# Altium footprint library 14-Inductors.PcbLib: 164 footprints (part 8 of 11)
Each footprint in its own frame and in the unit in brackets; x right, y up, seen from the top. Pads: shape width x height; smd on the part's side, far side on the other; paste and mask are expansions set on the pad; w line width, h text height; cw(c..) or ccw(c..) is an arc to the next point about the centre after c.
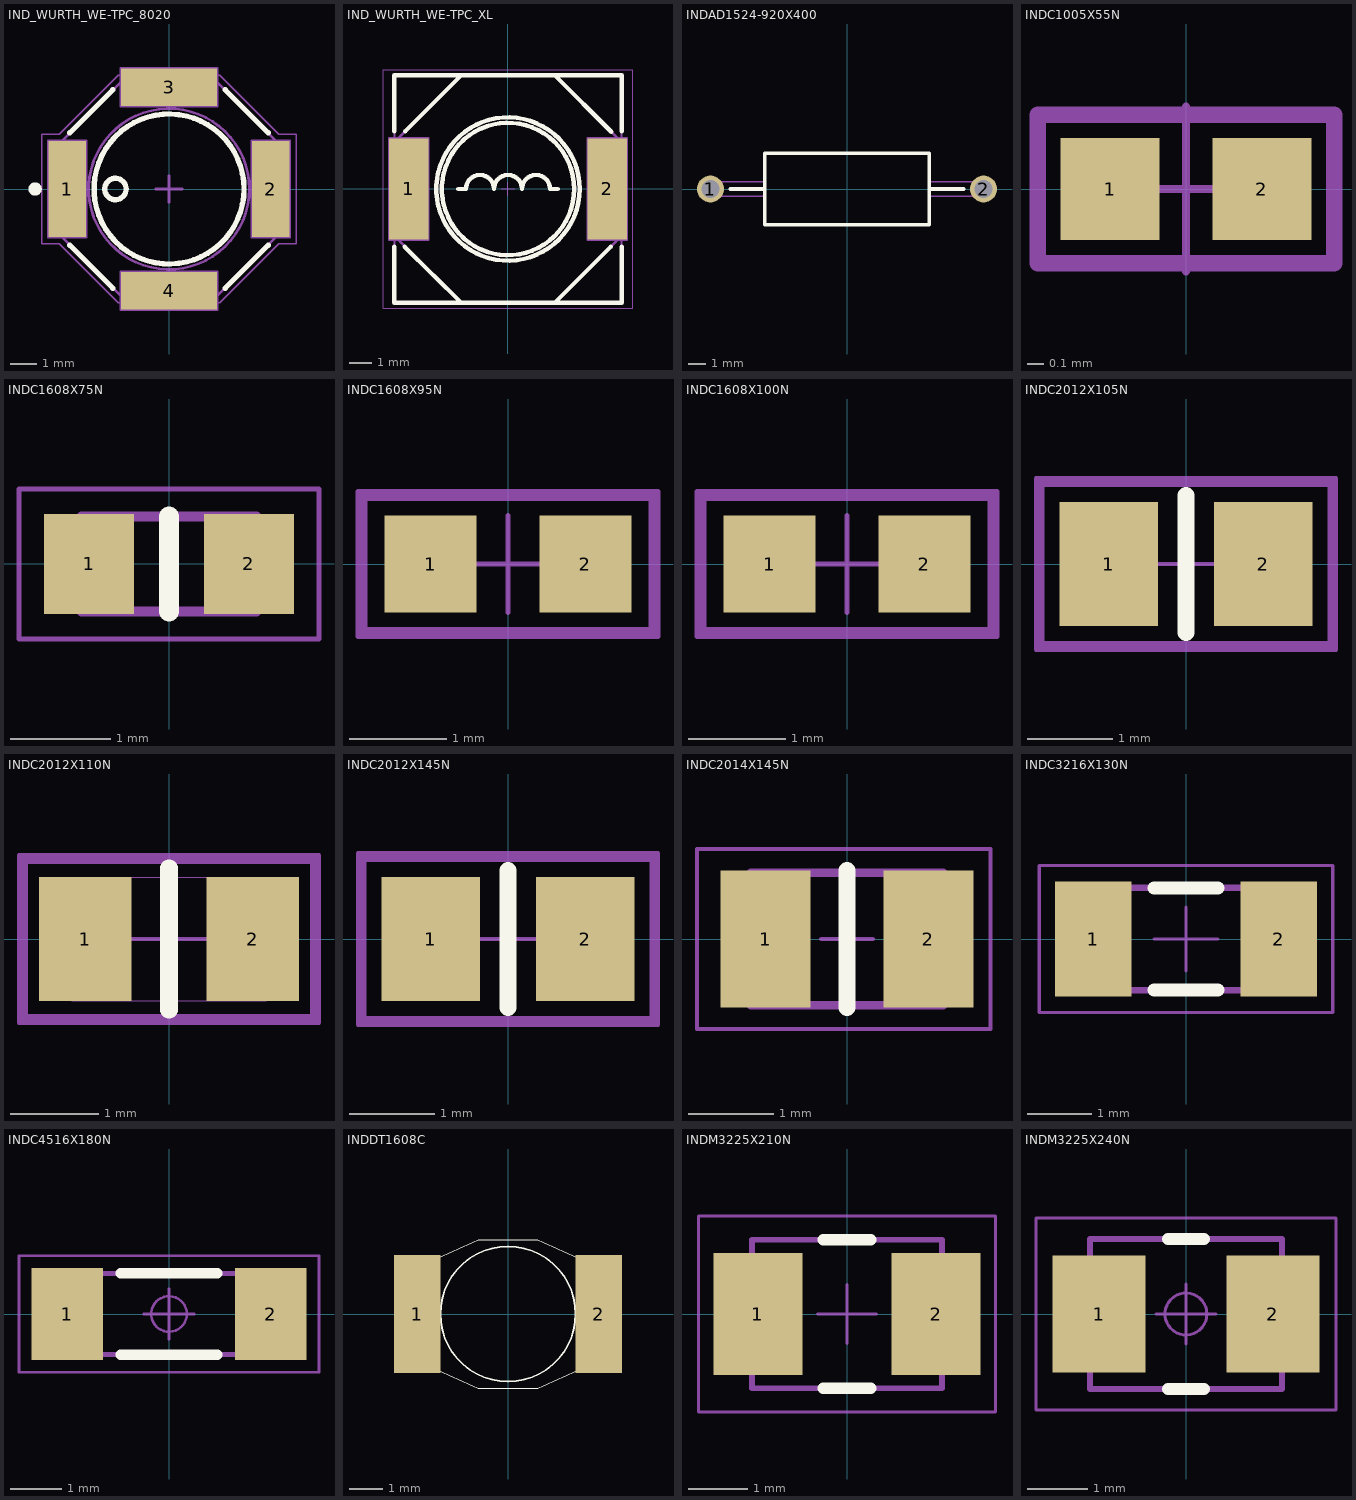
[diagram p7: the footprints below, top view; thin cyan lines are the x and y axes]

## IND_WURTH_WE-TPC_8020 [mm] "Power Choke Inductor, Body 8x8mm"
height 2
pads (4):
  rect 1.4x3.6 smd: 1(-3.8,0) 2(3.8,0)
  rect 3.6x1.4 smd: 3(0,3.8) 4(0,-3.8)
Top Overlay:
  circle w0.2: c-2,0 r0.4
  circle w0.25: c-5,0 r0.125
  circle w0.2: c0,0 r2.8
  lines w0.2: -3.7,-2.1 -2.1,-3.7 ; -3.7,2.1 -2.1,3.7 ; 2.1,-3.7 3.7,-2.1 ; 2.1,3.7 3.7,2.1
Mechanical 8:
  lines w0.1: -4.3,0 -3.8,0 ; -3.8,-0.5 -3.8,0 ; -3.8,0.5 -3.8,0 ; -3.3,0 -3.8,0 ; -0.5,-3.8 0,-3.8 ; -0.5,0 0,0 ; -0.5,3.8 0,3.8 ; 0,-4.3 0,-3.8 ; 0,-3.3 0,-3.8 ; 0,-0.5 0,0 ; 0,0.5 0,0 ; 0,3.3 0,3.8 ; 0,4.3 0,3.8 ; 0.5,-3.8 0,-3.8 ; 0.5,0 0,0 ; 0.5,3.8 0,3.8 ; 3.3,0 3.8,0 ; 3.8,-0.5 3.8,0 ; 3.8,0.5 3.8,0 ; 4.3,0 3.8,0 ; -4.5,-1.8 -3.1,-1.8 -3.1,1.8 -4.5,1.8 -4.5,-1.8 ; -1.8,-4.5 -1.8,-3.1 1.8,-3.1 1.8,-4.5 -1.8,-4.5 ; -1.8,3.1 -1.8,4.5 1.8,4.5 1.8,3.1 -1.8,3.1 ; 3.1,-1.8 4.5,-1.8 4.5,1.8 3.1,1.8 3.1,-1.8
Mechanical 14:
  circle w0.1: c-2,0 r0.4
  circle w0.1: c0,0 r3
  circle w0.1: c0,0 r2.8
  lines w0.1: -4,-1.8 -4,1.8 -1.8,4 1.8,4 4,1.8 4,-1.8 1.8,-4 -1.8,-4 -4,-1.8
Mechanical 15:
  lines w0.05: -4.75,-2.05 -4.104,-2.05 -1.904,-4.25 1.904,-4.25 4.104,-2.05 4.75,-2.05 4.75,2.05 4.104,2.05 1.904,4.25 -1.904,4.25 -4.104,2.05 -4.75,2.05 -4.75,-2.05
3D body "IND_WURTH_WE-TPC-8020.stp": height 2, standoff 0, extent -4,-4 4,4

## IND_WURTH_WE-TPC_XL [mm] "Shielded Tiny Power Inductor, Body 10.3x10.3mm"
height 3.1
pads (2):
  rect 1.8x4.6 smd: 1(-4.5,0) 2(4.5,0)
Top Overlay:
  circle w0.2: c0,0 r3.25
  circle w0.2: c0,0 r3
  lines w0.2: -5.15,-2.625 -5.15,-5.15 5.15,-5.15 5.15,-2.625 ; -5.15,2.625 -5.15,5.15 5.15,5.15 5.15,2.625 ; -4.675,-2.625 -2.133,-5.15 ; -4.65,2.625 -2.133,5.15 ; -2.25,0 -1.905,0 cw(c-1.27,0) -0.635,0 cw(c0,0) 0.635,0 cw(c1.27,0) 1.905,0 2.25,0 ; 2.133,-5.15 4.65,-2.625 ; 2.133,5.15 4.675,2.6
Mechanical 8:
  lines w0.1: -5.4,-2.3 -3.6,-2.3 -3.6,2.3 -5.4,2.3 -5.4,-2.3 ; 3.6,-2.3 5.4,-2.3 5.4,2.3 3.6,2.3 3.6,-2.3
Mechanical 14:
  circle w0.1: c0,0 r3
  circle w0.1: c0,0 r3.25
  lines w0.1: -5.15,-2.133 -2.133,-5.15 ; -5.15,2.133 -2.133,5.15 ; -2.25,0 -1.905,0 cw(c-1.27,0) -0.635,0 cw(c0,0) 0.635,0 cw(c1.27,0) 1.905,0 2.25,0 ; 2.133,-5.15 5.15,-2.133 ; 2.133,5.15 5.15,2.133 ; -5.15,-5.15 -5.15,5.15 5.15,5.15 5.15,-5.15 -5.15,-5.15
Mechanical 15:
  lines w0.05: -0.3,0 0.3,0 ; 0,-0.3 0,0.3 ; -5.65,-5.4 -5.65,5.4 5.65,5.4 5.65,-5.4 -5.65,-5.4
3D body "IND_WURTH_WE-TPC-XL.stp": height 3.1, standoff 0, extent -5.155,-5.155 5.145,5.145

## INDAD1524-920X400 [mm] "Inductor, Axial Diameter, Pad spacing 15.24 mm - Body Lengh 9.2mm X Body Diameter 4mm"
height 4
pads (2):
  round 1.5 hole 1: 1(-7.62,0) 2(7.62,0)
Top Overlay:
  lines w0.2: -6.5,0 -4.6,0 ; 4.6,0 6.5,0 ; -4.6,-2 4.6,-2 4.6,2 -4.6,2 -4.6,-2
Mechanical 14:
  lines w0.1: -7.62,-0.4 -4.6,-0.4 -4.6,0.4 -7.62,0.4 -7.62,-0.4 ; -4.6,-2 4.6,-2 4.6,2 -4.6,2 -4.6,-2 ; 4.6,-0.4 4.6,0.4 7.62,0.4 7.62,-0.4 4.6,-0.4
3D body "INDAD1524-920X400.stp": height 4, standoff -3.6, extent -8.02,-2 8.02,2

## INDC1005X55N [mm] "Chip Inductor, 2-Leads, EIA 0402, Metric 1005, Body 1x0.5mm, 0402IPC Medium Density"
height 0.55
pads (2):
  rect 0.6x0.62 smd: 1(-0.46,0) 2(0.46,0)
Mechanical 14:
  lines w0.1: -0.9,-0.45 -0.9,0.45 0.9,0.45 0.9,-0.45 -0.9,-0.45
Mechanical 15:
  lines w0.05: -0.5,0 0.5,0 ; 0,-0.5 0,0.5 ; -0.91,-0.46 -0.91,0.46 0.91,0.46 0.91,-0.46 -0.91,-0.46
3D body "INDC1005X55N.stp": height 0.55, standoff 0, extent -0.525,-0.275 0.525,0.275

## INDC1608X75N [mm] "Chip Inductor, 2-Leads, EIA 0603, Metric 1608, Body 1.6x0.8mm, IPC Medium Density"
height 0.75
pads (2):
  rect 0.9x1 smd: 1(-0.8,0) 2(0.8,0)
Top Overlay:
  lines w0.2: 0,-0.475 0,0.475
Mechanical 8:
  lines w0.025: -0.575,-0.475 -0.575,0.475 ; 0.575,-0.475 0.575,0.475 ; -0.875,-0.475 -0.875,0.475 0.875,0.475 0.875,-0.475 -0.875,-0.475
Mechanical 14:
  lines w0.1: -0.875,-0.475 0.875,-0.475 0.875,0.475 -0.875,0.475 -0.875,-0.475
Mechanical 15:
  lines w0.05: -1.5,-0.75 1.5,-0.75 1.5,0.75 -1.5,0.75 -1.5,-0.75
3D body "INDC1608X75N.stp": height 0.7, standoff -0.05, extent -0.875,-0.475 0.875,0.475

## INDC1608X95N [mm] "Chip Inductor, 2-Leads, EIA 0603, Metric 1608, Body 1.6x0.8mm, IPC Medium Density"
height 0.95
pads (2):
  rect 0.95x1 smd: 1(-0.8,0) 2(0.8,0)
Mechanical 14:
  lines w0.1: -1.5,-0.7 1.5,-0.7 1.5,0.7 -1.5,0.7 -1.5,-0.7
Mechanical 15:
  lines w0.05: -0.5,0 0.5,0 ; 0,-0.5 0,0.5 ; -1.55,-0.75 1.55,-0.75 1.55,0.75 -1.55,0.75 -1.55,-0.75
3D body "INDC1608X95N.stp": height 0.95, standoff -0.05, extent -0.875,-0.475 0.875,0.475

## INDC1608X100N [mm] "Chip Inductor, 2-Leads, EIA 0603, Metric 1608, Body 1.6x0.8mm, IPC Medium Density"
height 1
pads (2):
  rect 0.95x1 smd: 1(-0.8,0) 2(0.8,0)
Mechanical 14:
  lines w0.1: -1.5,-0.7 1.5,-0.7 1.5,0.7 -1.5,0.7 -1.5,-0.7
Mechanical 15:
  lines w0.05: -0.5,0 0.5,0 ; 0,-0.5 0,0.5 ; -1.55,-0.75 1.55,-0.75 1.55,0.75 -1.55,0.75 -1.55,-0.75
3D body "INDC1608X100N.stp": height 1, standoff -0.05, extent -0.875,-0.475 0.875,0.475

## INDC2012X105N [mm] "Chip Inductor, EIA 0805, Metric 2012, Body 2.0x1.25mm, IPC Medium Density"
height 1.05
pads (2):
  rect 1.15x1.45 smd: 1(-0.9,0) 2(0.9,0)
Top Overlay:
  lines w0.2: 0,-0.8 0,0.8
Mechanical 14:
  lines w0.1: -1.7,-0.95 1.7,-0.95 1.7,0.95 -1.7,0.95 -1.7,-0.95
Mechanical 15:
  lines w0.05: -0.5,0 0.5,0 ; 0,-0.5 0,0.5 ; -1.75,-1 1.75,-1 1.75,1 -1.75,1 -1.75,-1
3D body "INDC2012X110N.stp": height 1.1, standoff 0, extent -1.1,-0.7 1.1,0.7

## INDC2012X110N [mm] "Chip Inductor, EIA 0805, Metric 2012, Body 2.0x1.2mm, IPC Medium Density"
height 1.1
pads (2):
  rect 1.05x1.4 smd: 1(-0.95,0) 2(0.95,0)
Top Overlay:
  lines w0.2: 0,-0.8 0,0.8
Mechanical 14:
  lines w0.1: -1.65,-0.9 -1.65,0.9 1.65,0.9 1.65,-0.9 -1.65,-0.9
Mechanical 15:
  lines w0.001: -1.1,-0.7 -1.1,0.7 1.1,0.7 1.1,-0.7 -1.1,-0.7
  lines w0.05: -0.5,0 0.5,0 ; 0,-0.5 0,0.5 ; -1.7,-0.95 -1.7,0.95 1.7,0.95 1.7,-0.95 -1.7,-0.95
3D body "INDC2012X110N.stp": height 1.1, standoff 0, extent -1,-0.625 1,0.625

## INDC2012X145N [mm] "Chip Inductor, EIA 0805, Metric 2012, Body 2.0x1.25mm, IPC Medium Density"
height 1.45
pads (2):
  rect 1.15x1.45 smd: 1(-0.9,0) 2(0.9,0)
Top Overlay:
  lines w0.2: 0,-0.8 0,0.8
Mechanical 14:
  lines w0.1: -1.7,-0.95 1.7,-0.95 1.7,0.95 -1.7,0.95 -1.7,-0.95
Mechanical 15:
  lines w0.05: -0.5,0 0.5,0 ; 0,-0.5 0,0.5 ; -1.75,-1 1.75,-1 1.75,1 -1.75,1 -1.75,-1
3D body "INDC2012X145N.stp": height 1.45, standoff 0, extent -1,-0.625 1,0.625

## INDC2014X145N [mm] "Chip Inductor, EIA 0805, Metric 2014, Body 2.05x1.4mm, IPC Medium Density"
height 1.45
pads (2):
  rect 1.05x1.6 smd: 1(-0.95,0) 2(0.95,0)
Top Overlay:
  lines w0.2: 0,-0.8 0,0.8
Mechanical 13:
  lines w0.1: -1.125,-0.775 -1.125,0.775 1.125,0.775 1.125,-0.775 -1.125,-0.775
Mechanical 14:
  lines w0.1: -1.125,-0.775 -1.125,0.775 1.125,0.775 1.125,-0.775 -1.125,-0.775
Mechanical 15:
  lines w0.05: -0.3,0 0.3,0 ; 0,-0.3 0,0.3 ; -1.75,-1.05 -1.75,1.05 1.675,1.05 1.675,-1.05 -1.75,-1.05
3D body "INDC2014X145N.stp": height 1.45, standoff 0, extent -0.995,-0.662 1.205,0.738

## INDC3216X130N [mm] "Chip Inductor, EIA 1206, Metric 3216, 3.20mm L X 1.60mm W, IPC Medium Density"
height 1.3
pads (2):
  rect 1.2x1.8 smd: 1(-1.45,0) 2(1.45,0)
Top Overlay:
  lines w0.2: -0.5,-0.8 0.5,-0.8 ; -0.5,0.8 0.5,0.8
Mechanical 14:
  lines w0.1: -1.6,-0.8 1.6,-0.8 1.6,0.8 -1.6,0.8 -1.6,-0.8
Mechanical 15:
  lines w0.05: -0.5,0 0.5,0 ; 0,-0.5 0,0.5 ; -2.3,-1.15 2.3,-1.15 2.3,1.15 -2.3,1.15 -2.3,-1.15
3D body "INDC3216X130N.stp": height 1.3, standoff 0, extent -1.7,-0.9 1.7,0.9

## INDC4516X180N [mm] "Inductor, Chip; 4.50mm L X 1.60mm W X 1.80mm H, IPC Medium Density"
height 1.8
pads (2):
  rect 1.4x1.8 smd: 1(-2,0) 2(2,0)
Top Overlay:
  lines w0.2: -0.95,-0.8 0.95,-0.8 ; -0.95,0.8 0.95,0.8
Mechanical 14:
  lines w0.1: -2.25,-0.8 -2.25,0.8 2.25,0.8 2.25,-0.8 -2.25,-0.8
Mechanical 15:
  circle w0.05: c0,0 r0.35
  circle w0.05: c0,0 r0.35
  lines w0.05: -2.95,-1.15 -2.95,1.15 ; -2.95,-1.15 2.95,-1.15 ; -2.95,-1.15 -2.95,1.15 ; -2.95,-1.15 2.95,-1.15 ; -2.95,1.15 2.95,1.15 ; -2.95,1.15 2.95,1.15 ; 2.95,-1.15 2.95,1.15 ; 2.95,-1.15 2.95,1.15 ; -0.5,0 0.5,0 -0.5,0 ; 0,-0.5 0,0.5 0,-0.5
3D body "INDC4516X180N.stp": height 1.8, standoff 0, extent -2.25,-0.8 2.25,0.8

## INDDT1608C [mm]
height 0.55
pads (2):
  rect 1.4x3.56 smd: 1(-2.73,0)
  rect 1.4x3.56 smd mask+0.07: 2(2.73,0)
Top Overlay:
  circle w0.05: c0,0 r2.03
  lines w0.02: -3.3,-1.145 -0.89,-2.225 0.89,-2.225 3.3,-1.145 3.3,1.145 0.89,2.225 -0.89,2.225 -3.3,1.145 -3.3,-1.145
3D body "1_4-3_56-dtc1608c.stp": height 0.02, standoff 0, extent -3.442,-1.791 -2.042,1.769
3D body "1_4-3_56-dtc1608c.stp": height 0.02, standoff 0, extent 2.019,-1.778 3.419,1.782
3D body "dt1608c.stp": height 2.94, standoff 0, extent -3.3,-2.225 3.3,2.225

## INDM3225X210N [mm] "Inductor, Molded Body; 3.20mm L X 2.50mm W, IPC Medium Density"
height 2.1
pads (2):
  rect 1.5x2.05 smd: 1(-1.5,0) 2(1.5,0)
Top Overlay:
  lines w0.2: -0.4,-1.25 0.4,-1.25 ; -0.4,1.25 0.4,1.25
Mechanical 14:
  lines w0.1: -1.6,-1.25 -1.6,1.25 1.6,1.25 1.6,-1.25 -1.6,-1.25
Mechanical 15:
  lines w0.05: -0.5,0 0.5,0 ; 0,-0.5 0,0.5 ; -2.5,-1.65 -2.5,1.65 2.5,1.65 2.5,-1.65 -2.5,-1.65
3D body "INDM3225X210N.stp": height 2.1, standoff 0, extent -1.7,-1.35 1.7,1.35

## INDM3225X240N [mm] "Inductor, Molded Body; 3.20mm L X 2.50mm W, IPC Medium Density"
height 2.4
pads (2):
  rect 1.55x1.95 smd: 1(-1.45,0) 2(1.45,0)
Top Overlay:
  lines w0.2: -0.3,-1.25 0.3,-1.25 ; -0.3,1.25 0.3,1.25
Mechanical 14:
  lines w0.1: -1.6,-1.25 1.6,-1.25 1.6,1.25 -1.6,1.25 -1.6,-1.25
Mechanical 15:
  circle w0.05: c0,0 r0.35
  lines w0.05: -0.5,0 0.5,0 ; 0,-0.5 0,0.5 ; -2.5,-1.6 2.5,-1.6 2.5,1.6 -2.5,1.6 -2.5,-1.6
3D body "IND_EPCOS_B82422H.stp": height 2.4, standoff 0, extent -1.7,-1.35 1.7,1.35